# Altium footprint library Miscellaneous footprints.PcbLib: 84 footprints (part 3 of 6)
Each footprint in its own frame and in the unit in brackets; x right, y up, seen from the top. Pads: shape width x height; smd on the part's side, far side on the other; paste and mask are expansions set on the pad; w line width, h text height; cw(c..) or ccw(c..) is an arc to the next point about the centre after c.
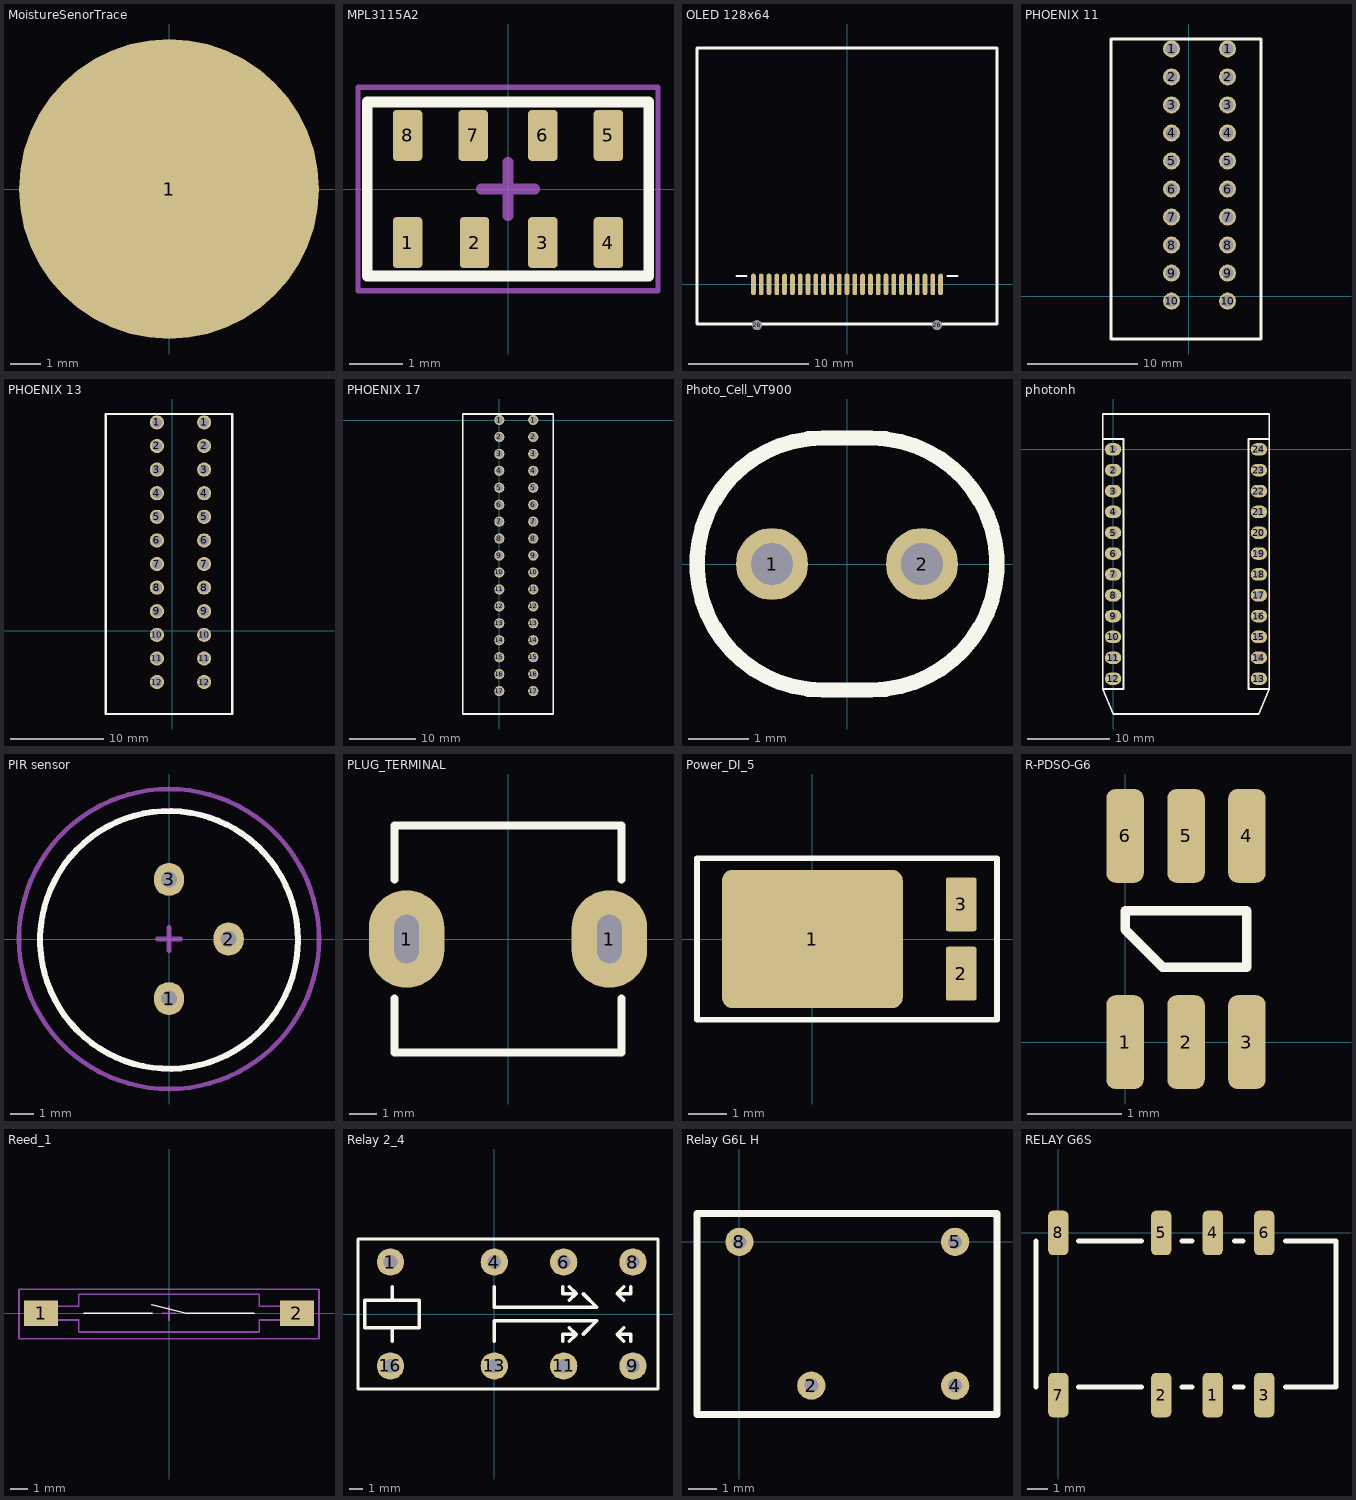
[diagram p2: the footprints below, top view; thin cyan lines are the x and y axes]

## MoistureSenorTrace [mm]
pads (1):
  round 10 smd paste-5 mask-5: 1(0,0)

## MPL3115A2 [mm] "MPL3115A2"
height 1.1
pads (8):
  rrect25% 0.55x0.95 smd: 1(-1.875,-1) 2(-0.625,-1) 3(0.65,-1) 4(1.875,-1) 5(1.875,1) 6(0.65,1) 7(-0.65,1) 8(-1.875,1)
Top Overlay:
  lines w0.2: -2.625,-1.625 -2.625,1.625 2.625,1.625 2.625,-1.625 -2.625,-1.625
Mechanical 15:
  lines w0.1: -2.8,-1.9 2.8,-1.9 2.8,1.9 -2.8,1.9 -2.8,-1.9
  lines w0.2: -0.5,0 0.5,0 ; 0,-0.5 0,0.5
3D body: height 1.1, standoff 0, extent -2.5,-1.5 2.5,1.5

## OLED 128x64 [mm] "OLED 128x64"
pads (27):
  oval 0.4x1.8 smd: 1(-7.8,0) 2(-7.15,0) 3(-6.5,0) 4(-5.85,0) 5(-5.2,0) 6(-4.55,0) 7(-3.9,0) 8(-3.25,0) 9(-2.6,0) 10(-1.95,0) 11(-1.3,0) 12(-0.65,0) 13(0,0) 14(0.65,0) 15(1.3,0) 16(1.95,0) 17(2.6,0) 18(3.25,0) 19(3.9,0) 20(4.55,0) 21(5.2,0) 22(5.85,0) 23(6.5,0) 24(7.15,0) 25(7.8,0)
  round 0.8 hole 0.8 unplated: 26(-7.5,-3.4) 26(7.5,-3.4)
Top Overlay:
  lines w0.2: -9.2,0.7 -8.4,0.7 ; 8.4,0.7 9.2,0.7
  lines w0.254: -12.5,-3.3 12.5,-3.3 12.5,19.7 -12.5,19.7 -12.5,-3.3
3D body: height 2.82, standoff 0, extent -12.5,-6 12.5,19.7

## PHOENIX 11 [mm]
pads (20):
  round 1.524 hole 1.1: 1(-1.575,22.425) 1(3.505,22.425) 2(-1.575,19.885) 2(3.505,19.885) 3(-1.575,17.345) 3(3.505,17.345) 4(-1.575,14.805) 4(3.505,14.805) 5(-1.575,12.265) 5(3.505,12.265) 6(-1.575,9.725) 6(3.505,9.725) 7(-1.575,7.185) 7(3.505,7.185) 8(-1.575,4.645) 8(3.505,4.645) 9(-1.575,2.105) 9(3.505,2.105) 10(-1.575,-0.435) 10(3.505,-0.435)
Top Overlay:
  lines w0.254: -1.575,23.325 -7.075,23.325 ; 6.525,-3.875 6.525,23.325 -7.075,23.325 ; 6.55,-3.875 -1.575,-3.875 -7.075,-3.875 -7.075,23.325
3D body: height 12.5, standoff 0, extent -7.202,-4.002 6.677,23.452

## PHOENIX 13 [mm]
pads (24):
  round 1.524 hole 1.1: 1(-1.625,22.425) 1(3.455,22.425) 2(-1.625,19.885) 2(3.455,19.885) 3(-1.625,17.345) 3(3.455,17.345) 4(-1.625,14.805) 4(3.455,14.805) 5(-1.625,12.265) 5(3.455,12.265) 6(-1.625,9.725) 6(3.455,9.725) 7(-1.625,7.185) 7(3.455,7.185) 8(-1.625,4.645) 8(3.455,4.645) 9(-1.625,2.105) 9(3.455,2.105) 10(-1.625,-0.435) 10(3.455,-0.435) 11(-1.625,-2.975) 11(3.455,-2.975) 12(-1.625,-5.515) 12(3.455,-5.515)
Top Overlay:
  lines w0.254: -1.625,23.325 -7.125,23.325 ; -7.125,23.325 -7.125,-8.95 -1.625,-8.95 6.475,-8.95 6.475,23.325 -7.125,23.325
3D body: height 12.5, standoff 0, extent -7.124,-8.949 6.474,23.324

## PHOENIX 17 [mil]
pads (34):
  round 60 hole 43.31: 1(0,0) 1(200,0) 2(0,-100) 2(200,-100) 3(0,-200) 3(200,-200) 4(0,-300) 4(200,-300) 5(0,-400) 5(200,-400) 6(0,-500) 6(200,-500) 7(0,-600) 7(200,-600) 8(0,-700) 8(200,-700) 9(0,-800) 9(200,-800) 10(0,-900) 10(200,-900) 11(0,-1000) 11(200,-1000) 12(0,-1100) 12(200,-1100) 13(0,-1200) 13(200,-1200) 14(0,-1300) 14(200,-1300) 15(0,-1400) 15(200,-1400) 16(0,-1500) 16(200,-1500) 17(0,-1600) 17(200,-1600)
Top Overlay:
  lines w10: 0,35.43 -216.54,35.43 ; -216.54,35.43 -216.54,-1735.24 0,-1735.24 318.9,-1735.24 318.9,-1635.43 318.9,35.43 -216.54,35.43
3D body: height 492.13, standoff 0, extent -221.54,-1740.24 323.9,40.43

## Photo_Cell_VT900 [mm] "Photo_Cell_VT900"
height 2.5
pads (2):
  round 1.2 hole 0.7: 1(-1.25,0) 2(1.25,0)
Top Overlay:
  lines w0.254: -0.4,-2.1 cw(c-0.4,0) -0.4,2.1 0.4,2.1 cw(c0.4,0) 0.4,-2.1 -0.4,-2.1
3D body: height 2.6, standoff -1, extent -2.44,-2.085 2.44,2.085

## photonh [mm]
pads (24):
  oval 2x1.524 hole 0.9: 1(0,0) 2(0,-2.54) 3(0,-5.08) 4(0,-7.62) 5(0,-10.16) 6(0,-12.7) 7(0,-15.24) 8(0,-17.78) 9(0,-20.32) 10(0,-22.86) 11(0,-25.4) 12(0,-27.94) 13(17.78,-27.94) 14(17.78,-25.4) 15(17.78,-22.86) 16(17.78,-20.32) 17(17.78,-17.78) 18(17.78,-15.24) 19(17.78,-12.7) 20(17.78,-10.16) 21(17.78,-7.62) 22(17.78,-5.08) 23(17.78,-2.54) 24(17.78,0)
Top Overlay:
  lines w0.2: -1.27,-29.21 0,-29.21 1.27,-29.21 1.27,1.27 0,1.27 -1.27,1.27 ; -1.27,-29.21 -1.27,1.27 ; -1.27,-29.21 0,-32.26 17.78,-32.26 19.05,-29.21 ; -1.27,1.27 -1.27,4.31 8.89,4.31 19.05,4.31 19.05,1.27 ; 19.05,-29.21 17.78,-29.21 16.51,-29.21 16.51,1.27 17.78,1.27 19.05,1.27 ; 19.05,-29.21 19.05,1.27
3D body: height 6, standoff 5, extent -1.37,-32.36 19.15,4.41

## PIR sensor [mm]
pads (3):
  oval 1.3x1.4 hole 0.7: 1(0,-2.54) 2(2.54,0) 3(0,2.54)
Top Overlay:
  circle w0.254: c0,-0.04 r5.5
Mechanical 13:
  circle w0.2: c0,0 r5.5
Mechanical 15:
  circle w0.2: c0,0 r6.4
  lines w0.2: -0.5,0 0.5,0 ; 0,-0.5 0,0.5
3D body: height 14.4, standoff 0, extent -5.5,-5.5 5.5,5.5

## PLUG_TERMINAL [mm] "chinese wall plug terminal"
pads (2):
  oval 2.8x3.6 hole 0.9 slot 1.8 at 90 deg: 1(-3.75,0) 1(3.75,0)
Top Overlay:
  lines w0.3: -4.2,-2.2 -4.2,-4.2 4.2,-4.2 4.2,-2.2 ; -4.2,2.2 -4.2,4.2 0,4.2 4.2,4.2 4.2,2.2

## Power_DI_5 [mm] "Power_DI_5"
height 1.15
pads (3):
  rrect15% 4.7x3.6 smd: 1(0,0)
  rrect15% 0.8x1.4 smd: 2(3.87,-0.9) 3(3.87,0.9)
Top Overlay:
  lines w0.15: -3,-2.1 -3,2.1 4.8,2.1 4.8,-2.1 -3,-2.1

## R-PDSO-G6 [mm] "R-PDSO-G6"
height 1.1
pads (6):
  rrect50% 0.4x1 smd: 1(0,0) 2(0.65,0) 3(1.3,0) 4(1.3,2.2) 5(0.65,2.2) 6(0,2.2)
Top Overlay:
  lines w0.1: 0,1.2 0,1.4 1.3,1.4 1.3,0.8 0.4,0.8 0,1.2

## Reed_1 [mm]
pads (2):
  rect 2x1.5 smd: 1(-7.5,0) 2(7.5,0)
Top Overlay:
  lines w0.1: -5,0 -1,0 ; -1,0.5 1,0 5,0
Mechanical 13:
  lines w0.1: -8.1,-0.4 -8.1,-0.4 ; -8.1,-0.4 -5.3,-0.4 -5.3,-1.1 5.3,-1.1 5.3,-0.4 8.1,-0.4 8.1,0.4 ; -8.1,-0.4 -8.1,0.4 -5.3,0.4 -5.3,1.1 5.3,1.1 5.3,0.4 8.1,0.4 ; 8.1,0.4 8.1,0.4
Mechanical 15:
  lines w0.1: -0.4,0 0.4,0 ; 0,-0.4 0,0.4 ; -8.8,-1.5 -8.8,0.8 -8.8,1.4 -4.5,1.4 8.8,1.4 8.8,0.4 8.8,-1.5 -5.1,-1.5 -8.8,-1.5
3D body: height 2.19, standoff 0, extent -5.25,-1.1 5.25,1.096
3D body: height 0.2, standoff 0, extent -8.1,-0.4 -6.9,0.4
3D body: height 0.2, standoff 0, extent 6.9,-0.4 8.1,0.4
3D body: height 1.1, standoff 0, extent 6.7,-0.4 6.9,0.4
3D body: height 1.1, standoff 0, extent -6.9,-0.4 -6.7,0.4
3D body: height 1.1, standoff 0.9, extent -6.7,-0.4 -5.2,0.4
3D body: height 1.1, standoff 0.9, extent 5.2,-0.4 6.7,0.4

## Relay 2_4 [mm] "Relay 2_4"
height 7.5
pads (8):
  round 2 hole 1: 1(-7.62,3.81) 4(0,3.81) 6(5.08,3.81) 8(10.16,3.81) 9(10.16,-3.81) 11(5.08,-3.81) 13(0,-3.81) 16(-7.62,-3.81)
Top Overlay:
  lines w0.254: -7.5,-2 -7.5,-1 ; -7.5,1 -7.5,2 ; 0,-2 0,-0.5 7.5,-0.5 6.5,-1.5 ; 0,2 0,0.5 7.5,0.5 6.5,1.5 ; 5,-2 5,-1.5 6,-1.5 ; 5,2 5,1.5 6,1.5 ; 5.5,-2 6,-1.5 ; 5.5,-1 6,-1.5 ; 5.5,1 6,1.5 ; 5.5,2 6,1.5 ; 9.5,-2 9,-1.5 ; 9.5,-1 9,-1.5 ; 9.5,1 9,1.5 ; 9.5,2 9,1.5 ; 10,-2 10,-1.5 9,-1.5 ; 10,2 10,1.5 9,1.5 ; -7.5,-1 -5.5,-1 -5.5,1 -9.5,1 -9.5,-1 -7.5,-1 ; 6,1.5 6,1.5 ; 6,1.5 6,1.5 ; 9,-1.5 9,-1.5 ; 9,1.5 9,1.5 ; -10,-5.5 12,-5.5 12,5.5 -10,5.5 -10,-5.5
3D body: height 7.5, standoff 0, extent -10,-5.5 12,5.5

## Relay G6L H [mm] "Relay G6L H"
height 4.2
pads (4):
  round 1 hole 0.5: 2(2.54,-5.08) 4(7.62,-5.08) 5(7.62,0) 8(0,0)
Top Overlay:
  lines w0.254: -1.5,-6.1 -1.5,1 9.1,1 9.1,-6.1 -1.5,-6.1

## RELAY G6S [mm] "RELAY G6S"
height 9.2
pads (8):
  rrect50% 1x2.2 smd: 1(7.62,-8) 2(5.08,-8) 3(10.16,-8) 4(7.62,0) 5(5.08,0) 6(10.16,0) 7(0,-8) 8(0,0)
Top Overlay:
  lines w0.254: -1.1,-7.6 -1.1,-0.4 ; 1,-7.6 4.1,-7.6 ; 1,-0.4 4.1,-0.4 ; 6.1,-7.6 6.6,-7.6 ; 6.1,-0.4 6.6,-0.4 ; 8.7,-7.6 9.1,-7.6 ; 8.7,-0.4 9.1,-0.4 ; 11.2,-7.6 13.7,-7.6 13.7,-0.4 11.2,-0.4
3D body: height 9.1, standoff 0.1, extent -1.1,-7.6 13.7,-0.4